# Altium footprint library SMDLibrary.PcbLib: 309 footprints (part 19 of 20)
Each footprint in its own frame and in the unit in brackets; x right, y up, seen from the top. Pads: shape width x height; smd on the part's side, far side on the other; paste and mask are expansions set on the pad; w line width, h text height; cw(c..) or ccw(c..) is an arc to the next point about the centre after c.
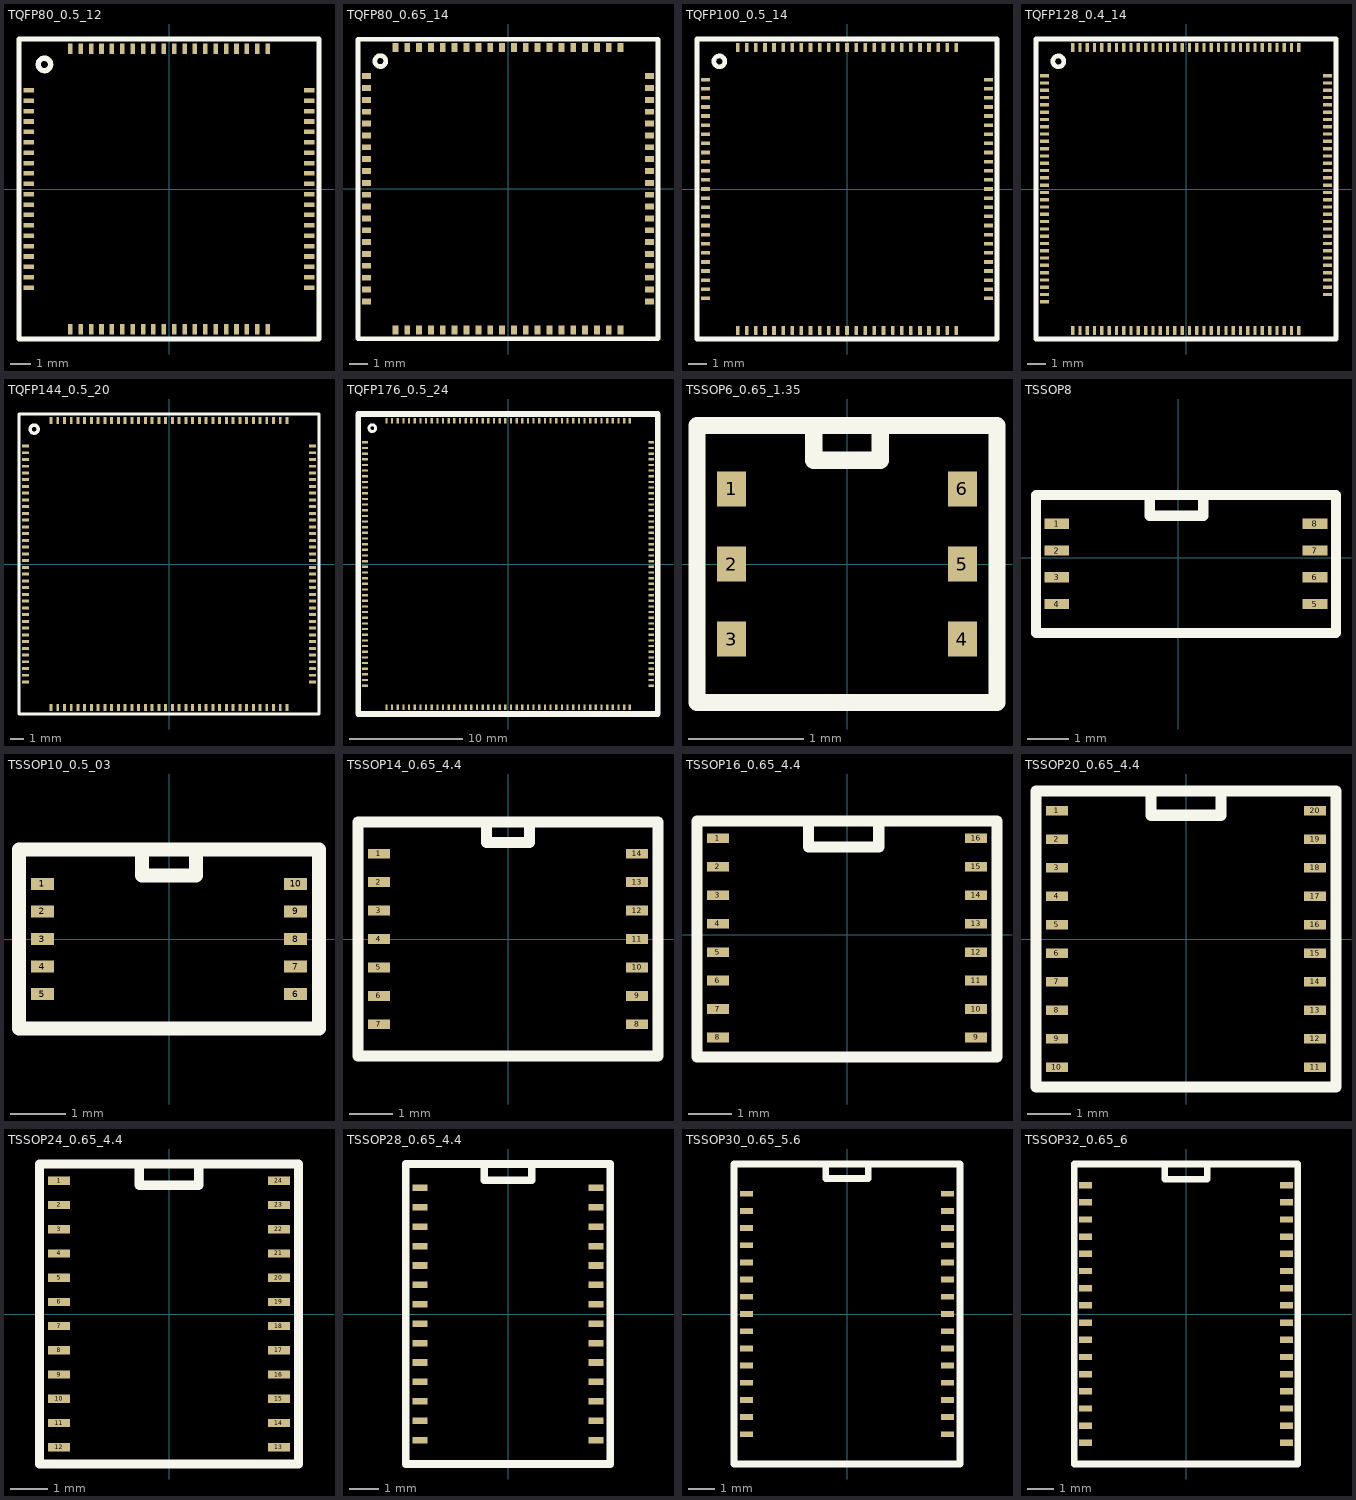
[diagram p18: the footprints below, top view; thin cyan lines are the x and y axes]

## TQFP80_0.5_12 [mm]
pads (80):
  rect 0.5x0.22 smd: 1(-6.75,4.75) 2(-6.75,4.25) 3(-6.75,3.75) 4(-6.75,3.25) 5(-6.75,2.75) 6(-6.75,2.25) 7(-6.75,1.75) 8(-6.75,1.25) 9(-6.75,0.75) 10(-6.75,0.25) 11(-6.75,-0.25) 12(-6.75,-0.75) 13(-6.75,-1.25) 14(-6.75,-1.75) 15(-6.75,-2.25) 16(-6.75,-2.75) 17(-6.75,-3.25) 18(-6.75,-3.75) 19(-6.75,-4.25) 20(-6.75,-4.75) 41(6.75,-4.75) 42(6.75,-4.25) 43(6.75,-3.75) 44(6.75,-3.25) 45(6.75,-2.75) 46(6.75,-2.25) 47(6.75,-1.75) 48(6.75,-1.25) 49(6.75,-0.75) 50(6.75,-0.25) 51(6.75,0.25) 52(6.75,0.75) 53(6.75,1.25) 54(6.75,1.75) 55(6.75,2.25) 56(6.75,2.75) 57(6.75,3.25) 58(6.75,3.75) 59(6.75,4.25) 60(6.75,4.75)
  rect 0.22x0.5 smd: 21(-4.75,-6.75) 22(-4.25,-6.75) 23(-3.75,-6.75) 24(-3.25,-6.75) 25(-2.75,-6.75) 26(-2.25,-6.75) 27(-1.75,-6.75) 28(-1.25,-6.75) 29(-0.75,-6.75) 30(-0.25,-6.75) 31(0.25,-6.75) 32(0.75,-6.75) 33(1.25,-6.75) 34(1.75,-6.75) 35(2.25,-6.75) 36(2.75,-6.75) 37(3.25,-6.75) 38(3.75,-6.75) 39(4.25,-6.75) 40(4.75,-6.75) 61(4.75,6.75) 62(4.25,6.75) 63(3.75,6.75) 64(3.25,6.75) 65(2.75,6.75) 66(2.25,6.75) 67(1.75,6.75) 68(1.25,6.75) 69(0.75,6.75) 70(0.25,6.75) 71(-0.25,6.75) 72(-0.75,6.75) 73(-1.25,6.75) 74(-1.75,6.75) 75(-2.25,6.75) 76(-2.75,6.75) 77(-3.25,6.75) 78(-3.75,6.75) 79(-4.25,6.75) 80(-4.75,6.75)
Top Overlay:
  circle w0.254: c-6,6 r0.3
  lines w0.254: -7.225,-7.225 7.225,-7.225 7.225,7.225 -7.225,7.225 -7.225,-7.225
3D body "User Library-TQFP-80.STEP": height 1.05, standoff -0.01, extent -7,-7 7,7
3D body: height 0.25, standoff 0, extent 0,0 0,0

## TQFP80_0.65_14 [mm]
pads (80):
  rect 0.5x0.32 smd: 1(-7.75,6.175) 2(-7.75,5.525) 3(-7.75,4.875) 4(-7.75,4.225) 5(-7.75,3.575) 6(-7.75,2.925) 7(-7.75,2.275) 8(-7.75,1.625) 9(-7.75,0.975) 10(-7.75,0.325) 11(-7.75,-0.325) 12(-7.75,-0.975) 13(-7.75,-1.625) 14(-7.75,-2.275) 15(-7.75,-2.925) 16(-7.75,-3.575) 17(-7.75,-4.225) 18(-7.75,-4.875) 19(-7.75,-5.525) 20(-7.75,-6.175) 41(7.75,-6.175) 42(7.75,-5.525) 43(7.75,-4.875) 44(7.75,-4.225) 45(7.75,-3.575) 46(7.75,-2.925) 47(7.75,-2.275) 48(7.75,-1.625) 49(7.75,-0.975) 50(7.75,-0.325) 51(7.75,0.325) 52(7.75,0.975) 53(7.75,1.625) 54(7.75,2.275) 55(7.75,2.925) 56(7.75,3.575) 57(7.75,4.225) 58(7.75,4.875) 59(7.75,5.525) 60(7.75,6.175)
  rect 0.32x0.5 smd: 21(-6.175,-7.75) 22(-5.525,-7.75) 23(-4.875,-7.75) 24(-4.225,-7.75) 25(-3.575,-7.75) 26(-2.925,-7.75) 27(-2.275,-7.75) 28(-1.625,-7.75) 29(-0.975,-7.75) 30(-0.325,-7.75) 31(0.325,-7.75) 32(0.975,-7.75) 33(1.625,-7.75) 34(2.275,-7.75) 35(2.925,-7.75) 36(3.575,-7.75) 37(4.225,-7.75) 38(4.875,-7.75) 39(5.525,-7.75) 40(6.175,-7.75) 61(6.175,7.75) 62(5.525,7.75) 63(4.875,7.75) 64(4.225,7.75) 65(3.575,7.75) 66(2.925,7.75) 67(2.275,7.75) 68(1.625,7.75) 69(0.975,7.75) 70(0.325,7.75) 71(-0.325,7.75) 72(-0.975,7.75) 73(-1.625,7.75) 74(-2.275,7.75) 75(-2.925,7.75) 76(-3.575,7.75) 77(-4.225,7.75) 78(-4.875,7.75) 79(-5.525,7.75) 80(-6.175,7.75)
Top Overlay:
  circle w0.254: c-7,7 r0.3
  lines w0.254: -8.225,-8.225 8.225,-8.225 8.225,8.2 -8.225,8.2 -8.225,-8.225
3D body "User Library-LQFP-80 14x14.STEP": height 1.55, standoff -0.04, extent -8.005,-8.009 8.005,8

## TQFP100_0.5_14 [mm]
pads (100):
  rect 0.5x0.2 smd: 1(-7.75,6) 2(-7.75,5.5) 3(-7.75,5) 4(-7.75,4.5) 5(-7.75,4) 6(-7.75,3.5) 7(-7.75,3) 8(-7.75,2.5) 9(-7.75,2) 10(-7.75,1.5) 11(-7.75,1) 12(-7.75,0.5) 13(-7.75,0) 14(-7.75,-0.5) 15(-7.75,-1) 16(-7.75,-1.5) 17(-7.75,-2) 18(-7.75,-2.5) 19(-7.75,-3) 20(-7.75,-3.5) 21(-7.75,-4) 22(-7.75,-4.5) 23(-7.75,-5) 24(-7.75,-5.5) 25(-7.75,-6) 51(7.75,-6) 52(7.75,-5.5) 53(7.75,-5) 54(7.75,-4.5) 55(7.75,-4) 56(7.75,-3.5) 57(7.75,-3) 58(7.75,-2.5) 59(7.75,-2) 60(7.75,-1.5) 61(7.75,-1) 62(7.75,-0.5) 63(7.75,0) 64(7.75,0.5) 65(7.75,1) 66(7.75,1.5) 67(7.75,2) 68(7.75,2.5) 69(7.75,3) 70(7.75,3.5) 71(7.75,4) 72(7.75,4.5) 73(7.75,5) 74(7.75,5.5) 75(7.75,6)
  rect 0.2x0.5 smd: 26(-6,-7.75) 27(-5.5,-7.75) 28(-5,-7.75) 29(-4.5,-7.75) 30(-4,-7.75) 31(-3.5,-7.75) 32(-3,-7.75) 33(-2.5,-7.75) 34(-2,-7.75) 35(-1.5,-7.75) 36(-1,-7.75) 37(-0.5,-7.75) 38(0,-7.75) 39(0.5,-7.75) 40(1,-7.75) 41(1.5,-7.75) 42(2,-7.75) 43(2.5,-7.75) 44(3,-7.75) 45(3.5,-7.75) 46(4,-7.75) 47(4.5,-7.75) 48(5,-7.75) 49(5.5,-7.75) 50(6,-7.75) 76(6,7.75) 77(5.5,7.75) 78(5,7.75) 79(4.5,7.75) 80(4,7.75) 81(3.5,7.75) 82(3,7.75) 83(2.5,7.75) 84(2,7.75) 85(1.5,7.75) 86(1,7.75) 87(0.5,7.75) 88(0,7.75) 89(-0.5,7.75) 90(-1,7.75) 91(-1.5,7.75) 92(-2,7.75) 93(-2.5,7.75) 94(-3,7.75) 95(-3.5,7.75) 96(-4,7.75) 97(-4.5,7.75) 98(-5,7.75) 99(-5.5,7.75) 100(-6,7.75)
Top Overlay:
  circle w0.254: c-7,7 r0.3
  lines w0.254: -8.225,-8.225 -8.225,8.225 8.225,8.225 8.225,-8.225 -8.225,-8.225
3D body "User Library-LQFP100_Grid_0_5.STEP": height 1.57, standoff -0.03, extent -8,-8 8,8
3D body: height 0.5, standoff -0.56, extent 0,0 0,0

## TQFP128_0.4_14 [mm]
pads (128):
  rect 0.5x0.18 smd: 1(-7.75,6.213) 2(-7.75,5.813) 3(-7.75,5.413) 4(-7.75,5.013) 5(-7.75,4.613) 6(-7.75,4.213) 7(-7.75,3.813) 8(-7.75,3.413) 9(-7.75,3.013) 10(-7.75,2.613) 11(-7.75,2.213) 12(-7.75,1.813) 13(-7.75,1.413) 14(-7.75,1.013) 15(-7.75,0.613) 16(-7.75,0.213) 17(-7.75,-0.187) 18(-7.75,-0.587) 19(-7.75,-0.987) 20(-7.75,-1.387) 21(-7.75,-1.787) 22(-7.75,-2.187) 23(-7.75,-2.587) 24(-7.75,-2.987) 25(-7.75,-3.387) 26(-7.75,-3.787) 27(-7.75,-4.187) 28(-7.75,-4.587) 29(-7.75,-4.987) 30(-7.75,-5.387) 31(-7.75,-5.787) 32(-7.75,-6.187) 65(7.75,-5.787) 66(7.75,-5.387) 67(7.75,-4.987) 68(7.75,-4.587) 69(7.75,-4.187) 70(7.75,-3.787) 71(7.75,-3.387) 72(7.75,-2.987) 73(7.75,-2.987) 74(7.75,-2.587) 75(7.75,-2.187) 76(7.75,-1.787) 77(7.75,-1.387) 78(7.75,-0.987) 79(7.75,-0.587) 80(7.75,-0.187) 81(7.75,0.213) 82(7.75,0.613) 83(7.75,1.013) 84(7.75,1.413) 85(7.75,1.813) 86(7.75,2.213) 87(7.75,2.613) 88(7.75,3.013) 89(7.75,3.413) 90(7.75,3.813) 91(7.75,4.213) 92(7.75,4.613) 93(7.75,5.013) 94(7.75,5.413) 95(7.75,5.813) 96(7.75,6.213)
  rect 0.18x0.5 smd: 33(-6.212,-7.75) 34(-5.813,-7.75) 35(-5.412,-7.75) 36(-5.012,-7.75) 37(-4.613,-7.75) 38(-4.212,-7.75) 39(-3.812,-7.75) 40(-3.413,-7.75) 41(-3.012,-7.75) 42(-2.613,-7.75) 43(-2.213,-7.75) 44(-1.813,-7.75) 45(-1.413,-7.75) 46(-1.013,-7.75) 47(-0.613,-7.75) 48(-0.213,-7.75) 49(0.187,-7.75) 50(0.587,-7.75) 51(0.987,-7.75) 52(1.387,-7.75) 53(1.787,-7.75) 54(2.187,-7.75) 55(2.587,-7.75) 56(2.987,-7.75) 57(3.387,-7.75) 58(3.787,-7.75) 59(4.187,-7.75) 60(4.587,-7.75) 61(4.987,-7.75) 62(5.387,-7.75) 63(5.787,-7.75) 64(6.187,-7.75) 97(6.188,7.75) 98(5.787,7.75) 99(5.388,7.75) 100(4.988,7.75) 101(4.587,7.75) 102(4.187,7.75) 103(3.788,7.75) 104(3.387,7.75) 105(2.987,7.75) 106(2.588,7.75) 107(2.187,7.75) 108(1.787,7.75) 109(1.388,7.75) 110(0.987,7.75) 111(0.587,7.75) 112(0.188,7.75) 113(-0.213,7.75) 114(-0.613,7.75) 115(-1.012,7.75) 116(-1.413,7.75) 117(-1.813,7.75) 118(-2.213,7.75) 119(-2.613,7.75) 120(-3.013,7.75) 121(-3.413,7.75) 122(-3.813,7.75) 123(-4.213,7.75) 124(-4.613,7.75) 125(-5.012,7.75) 126(-5.413,7.75) 127(-5.813,7.75) 128(-6.212,7.75)
Top Overlay:
  circle w0.254: c-7,7 r0.3
  lines w0.254: -8.225,-8.225 8.225,-8.225 8.225,8.225 -8.225,8.225 -8.225,-8.225
3D body "User Library-LQFP-128.STEP": height 1.35, standoff 0, extent -8,-8 8,8

## TQFP144_0.5_20 [mm]
pads (144):
  rect 0.5x0.22 smd: 1(-10.65,8.75) 2(-10.65,8.25) 3(-10.65,7.75) 4(-10.65,7.25) 5(-10.65,6.75) 6(-10.65,6.25) 7(-10.65,5.75) 8(-10.65,5.25) 9(-10.65,4.75) 10(-10.65,4.25) 11(-10.65,3.75) 12(-10.65,3.25) 13(-10.65,2.75) 14(-10.65,2.25) 15(-10.65,1.75) 16(-10.65,1.25) 17(-10.65,0.75) 18(-10.65,0.25) 19(-10.65,-0.25) 20(-10.65,-0.75) 21(-10.65,-1.25) 22(-10.65,-1.75) 23(-10.65,-2.25) 24(-10.65,-2.75) 25(-10.65,-3.25) 26(-10.65,-3.75) 27(-10.65,-4.25) 28(-10.65,-4.75) 29(-10.65,-5.25) 30(-10.65,-5.75) 31(-10.65,-6.25) 32(-10.65,-6.75) 33(-10.65,-7.25) 34(-10.65,-7.75) 35(-10.65,-8.25) 36(-10.65,-8.75) 73(10.65,-8.75) 74(10.65,-8.25) 75(10.65,-7.75) 76(10.65,-7.25) 77(10.65,-6.75) 78(10.65,-6.25) 79(10.65,-5.75) 80(10.65,-5.25) 81(10.65,-4.75) 82(10.65,-4.25) 83(10.65,-3.75) 84(10.65,-3.25) 85(10.65,-2.75) 86(10.65,-2.25) 87(10.65,-1.75) 88(10.65,-1.25) 89(10.65,-0.75) 90(10.65,-0.25) 91(10.65,0.25) 92(10.65,0.75) 93(10.65,1.25) 94(10.65,1.75) 95(10.65,2.25) 96(10.65,2.75) 97(10.65,3.25) 98(10.65,3.75) 99(10.65,4.25) 100(10.65,4.75) 101(10.65,5.25) 102(10.65,5.75) 103(10.65,6.25) 104(10.65,6.75) 105(10.65,7.25) 106(10.65,7.75) 107(10.65,8.25) 108(10.65,8.75)
  rect 0.22x0.5 smd: 37(-8.75,-10.65) 38(-8.25,-10.65) 39(-7.75,-10.65) 40(-7.25,-10.65) 41(-6.75,-10.65) 42(-6.25,-10.65) 43(-5.75,-10.65) 44(-5.25,-10.65) 45(-4.75,-10.65) 46(-4.25,-10.65) 47(-3.75,-10.65) 48(-3.25,-10.65) 49(-2.75,-10.65) 50(-2.25,-10.65) 51(-1.75,-10.65) 52(-1.25,-10.65) 53(-0.75,-10.65) 54(-0.25,-10.65) 55(0.25,-10.65) 56(0.75,-10.65) 57(1.25,-10.65) 58(1.75,-10.65) 59(2.25,-10.65) 60(2.75,-10.65) 61(3.25,-10.65) 62(3.75,-10.65) 63(4.25,-10.65) 64(4.75,-10.65) 65(5.25,-10.65) 66(5.75,-10.65) 67(6.25,-10.65) 68(6.75,-10.65) 69(7.25,-10.65) 70(7.75,-10.65) 71(8.25,-10.65) 72(8.75,-10.65) 109(8.75,10.65) 110(8.25,10.65) 111(7.75,10.65) 112(7.25,10.65) 113(6.75,10.65) 114(6.25,10.65) 115(5.75,10.65) 116(5.25,10.65) 117(4.75,10.65) 118(4.25,10.65) 119(3.75,10.65) 120(3.25,10.65) 121(2.75,10.65) 122(2.25,10.65) 123(1.75,10.65) 124(1.25,10.65) 125(0.75,10.65) 126(0.25,10.65) 127(-0.25,10.65) 128(-0.75,10.65) 129(-1.25,10.65) 130(-1.75,10.65) 131(-2.25,10.65) 132(-2.75,10.65) 133(-3.25,10.65) 134(-3.75,10.65) 135(-4.25,10.65) 136(-4.75,10.65) 137(-5.25,10.65) 138(-5.75,10.65) 139(-6.25,10.65) 140(-6.75,10.65) 141(-7.25,10.65) 142(-7.75,10.65) 143(-8.25,10.65) 144(-8.75,10.65)
Top Overlay:
  circle w0.254: c-10,10 r0.3
  lines w0.254: -11.125,-11.125 -11.125,11.125 11.125,11.125 11.125,-11.125 -11.125,-11.125
3D body "User Library-LQFP144-0_5.STEP": height 1.55, standoff -0.02, extent -10.886,-10.886 10.886,10.886

## TQFP176_0.5_24 [mm]
pads (176):
  rect 0.5x0.2 smd: 1(-12.65,10.75) 2(-12.65,10.25) 3(-12.65,9.75) 4(-12.65,9.25) 5(-12.65,8.75) 6(-12.65,8.25) 7(-12.65,7.75) 8(-12.65,7.25) 9(-12.65,6.75) 10(-12.65,6.25) 11(-12.65,5.75) 12(-12.65,5.25) 13(-12.65,4.75) 14(-12.65,4.25) 15(-12.65,3.75) 16(-12.65,3.25) 17(-12.65,2.75) 18(-12.65,2.25) 19(-12.65,1.75) 20(-12.65,1.25) 21(-12.65,0.75) 22(-12.65,0.25) 23(-12.65,-0.25) 24(-12.65,-0.75) 25(-12.65,-1.25) 26(-12.65,-1.75) 27(-12.65,-2.25) 28(-12.65,-2.75) 29(-12.65,-3.25) 30(-12.65,-3.75) 31(-12.65,-4.25) 32(-12.65,-4.75) 33(-12.65,-5.25) 34(-12.65,-5.75) 35(-12.65,-6.25) 36(-12.65,-6.75) 37(-12.65,-7.25) 38(-12.65,-7.75) 39(-12.65,-8.25) 40(-12.65,-8.75) 41(-12.65,-9.25) 42(-12.65,-9.75) 43(-12.65,-10.25) 44(-12.65,-10.75) 89(12.65,-10.75) 90(12.65,-10.25) 91(12.65,-9.75) 92(12.65,-9.25) 93(12.65,-8.75) 94(12.65,-8.25) 95(12.65,-7.75) 96(12.65,-7.25) 97(12.65,-6.75) 98(12.65,-6.25) 99(12.65,-5.75) 100(12.65,-5.25) 101(12.65,-4.75) 102(12.65,-4.25) 103(12.65,-3.75) 104(12.65,-3.25) 105(12.65,-2.75) 106(12.65,-2.25) 107(12.65,-1.75) 108(12.65,-1.25) 109(12.65,-0.75) 110(12.65,-0.25) 111(12.65,0.25) 112(12.65,0.75) 113(12.65,1.25) 114(12.65,1.75) 115(12.65,2.25) 116(12.65,2.75) 117(12.65,3.25) 118(12.65,3.75) 119(12.65,4.25) 120(12.65,4.75) 121(12.65,5.25) 122(12.65,5.75) 123(12.65,6.25) 124(12.65,6.75) 125(12.65,7.25) 126(12.65,7.75) 127(12.65,8.25) 128(12.65,8.75) 129(12.65,9.25) 130(12.65,9.75) 131(12.65,10.25) 132(12.65,10.75)
  rect 0.2x0.5 smd: 45(-10.75,-12.65) 46(-10.25,-12.65) 47(-9.75,-12.65) 48(-9.25,-12.65) 49(-8.75,-12.65) 50(-8.25,-12.65) 51(-7.75,-12.65) 52(-7.25,-12.65) 53(-6.75,-12.65) 54(-6.25,-12.65) 55(-5.75,-12.65) 56(-5.25,-12.65) 57(-4.75,-12.65) 58(-4.25,-12.65) 59(-3.75,-12.65) 60(-3.25,-12.65) 61(-2.75,-12.65) 62(-2.25,-12.65) 63(-1.75,-12.65) 64(-1.25,-12.65) 65(-0.75,-12.65) 66(-0.25,-12.65) 67(0.25,-12.65) 68(0.75,-12.65) 69(1.25,-12.65) 70(1.75,-12.65) 71(2.25,-12.65) 72(2.75,-12.65) 73(3.25,-12.65) 74(3.75,-12.65) 75(4.25,-12.65) 76(4.75,-12.65) 77(5.25,-12.65) 78(5.75,-12.65) 79(6.25,-12.65) 80(6.75,-12.65) 81(7.25,-12.65) 82(7.75,-12.65) 83(8.25,-12.65) 84(8.75,-12.65) 85(9.25,-12.65) 86(9.75,-12.65) 87(10.25,-12.65) 88(10.75,-12.65) 133(10.75,12.65) 134(10.25,12.65) 135(9.75,12.65) 136(9.25,12.65) 137(8.75,12.65) 138(8.25,12.65) 139(7.75,12.65) 140(7.25,12.65) 141(6.75,12.65) 142(6.25,12.65) 143(5.75,12.65) 144(5.25,12.65) 145(4.75,12.65) 146(4.25,12.65) 147(3.75,12.65) 148(3.25,12.65) 149(2.75,12.65) 150(2.25,12.65) 151(1.75,12.65) 152(1.25,12.65) 153(0.75,12.65) 154(0.25,12.65) 155(-0.25,12.65) 156(-0.75,12.65) 157(-1.25,12.65) 158(-1.75,12.65) 159(-2.25,12.65) 160(-2.75,12.65) 161(-3.25,12.65) 162(-3.75,12.65) 163(-4.25,12.65) 164(-4.75,12.65) 165(-5.25,12.65) 166(-5.75,12.65) 167(-6.25,12.65) 168(-6.75,12.65) 169(-7.25,12.65) 170(-7.75,12.65) 171(-8.25,12.65) 172(-8.75,12.65) 173(-9.25,12.65) 174(-9.75,12.65) 175(-10.25,12.65) 176(-10.75,12.65)
Top Overlay:
  circle w0.254: c-12,12 r0.3
  lines w0.5: -13.25,-13.25 -13.25,13.25 13.225,13.25 13.225,-13.25 -13.25,-13.25
3D body "User Library-LQFP176-0_5.STEP": height 1.55, standoff -0.02, extent -12.886,-12.886 12.886,12.886

## TSSOP6_0.65_1.35 [mm]
pads (6):
  rect 0.25x0.3 smd: 1(-1,0.65) 2(-1,0) 3(-1,-0.65) 4(1,-0.65) 5(1,0) 6(1,0.65)
Top Overlay:
  lines w0.15: -0.288,1.175 -0.288,0.9 0.288,0.9 0.288,1.175 ; -1.3,-1.2 -1.3,1.2 1.3,1.2 1.3,-1.2 -1.3,-1.2
3D body "User Library-TSSOP-6 (SOT-23-6 PITCH 0_65).STEP": height 1.09, standoff -0.02, extent -1.125,-1.125 1.125,1.125

## TSSOP8 [mm]
pads (8):
  rect 0.6x0.25 smd: 1(-2.95,0.825) 2(-2.95,0.175) 3(-2.95,-0.475) 4(-2.95,-1.125) 5(3.325,-1.125) 6(3.325,-0.475) 7(3.325,0.175) 8(3.325,0.825)
Top Overlay:
  lines w0.254: -0.686,1.524 -0.686,1.025 0.61,1.025 0.61,1.524 ; -3.454,-1.829 -3.454,1.524 3.835,1.524 3.835,-1.829 -3.454,-1.829
3D body "User Library-TSSOP-8 3_1x4_4.STEP": height 1.1, standoff 0, extent -3,-1.7 3.4,1.4

## TSSOP10_0.5_03 [mm]
pads (10):
  rect 0.42x0.22 smd: 1(-2.3,1) 2(-2.3,0.5) 3(-2.3,0) 4(-2.3,-0.5) 5(-2.3,-1) 6(2.3,-1) 7(2.3,-0.5) 8(2.3,0) 9(2.3,0.5) 10(2.3,1)
Top Overlay:
  lines w0.254: -0.487,1.6 -0.487,1.15 0.487,1.15 0.487,1.6 ; -2.725,-1.625 -2.725,1.625 2.725,1.625 2.725,-1.625 -2.725,-1.625
3D body "User Library-TSSOP-10.STEP": height 1.1, standoff 0, extent -2.5,-1.5 2.5,1.5

## TSSOP14_0.65_4.4 [mm]
pads (14):
  rect 0.5x0.22 smd: 1(-2.95,1.95) 2(-2.95,1.3) 3(-2.95,0.65) 4(-2.95,0) 5(-2.95,-0.65) 6(-2.95,-1.3) 7(-2.95,-1.95) 8(2.95,-1.95) 9(2.95,-1.3) 10(2.95,-0.65) 11(2.95,0) 12(2.95,0.65) 13(2.95,1.3) 14(2.95,1.95)
Top Overlay:
  lines w0.254: -0.487,2.65 -0.487,2.2 0.487,2.2 0.487,2.65 ; -3.425,-2.675 -3.425,2.675 3.425,2.675 3.425,-2.675 -3.425,-2.675
3D body "User Library-TSSOP-14 5_1x4_4.STEP": height 1.08, standoff -0.02, extent -3.2,-2.55 3.2,2.55

## TSSOP16_0.65_4.4 [mm]
pads (16):
  rect 0.5x0.22 smd: 1(-2.95,2.2) 2(-2.95,1.55) 3(-2.95,0.9) 4(-2.95,0.25) 5(-2.95,-0.4) 6(-2.95,-1.05) 7(-2.95,-1.7) 8(-2.95,-2.35) 9(2.95,-2.35) 10(2.95,-1.7) 11(2.95,-1.05) 12(2.95,-0.4) 13(2.95,0.25) 14(2.95,0.9) 15(2.95,1.55) 16(2.95,2.2)
Top Overlay:
  lines w0.254: -0.875,2.54 -0.875,2 0.725,2 0.725,2.565 ; -3.425,-2.794 -3.425,2.591 3.425,2.591 3.425,-2.794 -3.425,-2.794
3D body "User Library-TSSOP-16 5_1x4_4.STEP": height 1.1, standoff 0, extent -3.2,-2.65 3.2,2.45

## TSSOP20_0.65_4.4 [mm]
pads (20):
  rect 0.5x0.22 smd: 1(-2.95,2.925) 2(-2.95,2.275) 3(-2.95,1.625) 4(-2.95,0.975) 5(-2.95,0.325) 6(-2.95,-0.325) 7(-2.95,-0.975) 8(-2.95,-1.625) 9(-2.95,-2.275) 10(-2.95,-2.925) 11(2.95,-2.925) 12(2.95,-2.275) 13(2.95,-1.625) 14(2.95,-0.975) 15(2.95,-0.325) 16(2.95,0.325) 17(2.95,0.975) 18(2.95,1.625) 19(2.95,2.275) 20(2.95,2.925)
Top Overlay:
  lines w0.254: -0.8,3.365 -0.8,2.825 0.8,2.825 0.8,3.35 ; -3.425,-3.378 3.425,-3.378 3.425,3.378 -3.425,3.378 -3.425,-3.378
3D body "User Library-TSSOP20-1.STEP": height 1.09, standoff 0, extent -3.14,-3.25 3.14,3.25

## TSSOP24_0.65_4.4 [mm]
pads (24):
  rect 0.6x0.22 smd: 1(-2.95,3.575) 2(-2.95,2.925) 3(-2.95,2.275) 4(-2.95,1.625) 5(-2.95,0.975) 6(-2.95,0.325) 7(-2.95,-0.325) 8(-2.95,-0.975) 9(-2.95,-1.625) 10(-2.95,-2.275) 11(-2.95,-2.925) 12(-2.95,-3.575) 13(2.95,-3.575) 14(2.95,-2.925) 15(2.95,-2.275) 16(2.95,-1.625) 17(2.95,-0.975) 18(2.95,-0.325) 19(2.95,0.325) 20(2.95,0.975) 21(2.95,1.625) 22(2.95,2.275) 23(2.95,2.925) 24(2.95,3.575)
Top Overlay:
  lines w0.254: -0.8,3.99 -0.8,3.45 0.8,3.45 0.8,3.975 ; -3.475,-4.025 3.475,-4.025 3.475,4.025 -3.475,4.025 -3.475,-4.025
3D body "User Library-TSSOP-24.STEP": height 1.2, standoff 0, extent -3.2,-3.9 3.2,3.9

## TSSOP28_0.65_4.4 [mm]
pads (28):
  rect 0.5x0.22 smd: 1(-2.95,4.225) 2(-2.95,3.575) 3(-2.95,2.925) 4(-2.95,2.275) 5(-2.95,1.625) 6(-2.95,0.975) 7(-2.95,0.325) 8(-2.95,-0.325) 9(-2.95,-0.975) 10(-2.95,-1.625) 11(-2.95,-2.275) 12(-2.95,-2.925) 13(-2.95,-3.575) 14(-2.95,-4.225) 15(2.95,-4.225) 16(2.95,-3.575) 17(2.95,-2.925) 18(2.95,-2.275) 19(2.95,-1.625) 20(2.95,-0.975) 21(2.95,-0.325) 22(2.95,0.325) 23(2.95,0.975) 24(2.95,1.625) 25(2.95,2.275) 26(2.95,2.925) 27(2.95,3.575) 28(2.95,4.225)
Top Overlay:
  lines w0.254: -0.8,5.015 -0.8,4.475 0.8,4.475 0.8,5 ; -3.425,-5.025 3.425,-5.025 3.425,5.025 -3.425,5.025 -3.425,-5.025
3D body "User Library-TSSOP-28 9_8x4_4.STEP": height 1.1, standoff 0, extent -3.175,-4.9 3.225,4.9

## TSSOP30_0.65_5.6 [mm]
pads (30):
  rect 0.5x0.22 smd: 1(-3.8,4.55) 2(-3.8,3.9) 3(-3.8,3.25) 4(-3.8,2.6) 5(-3.8,1.95) 6(-3.8,1.3) 7(-3.8,0.65) 8(-3.8,0) 9(-3.8,-0.65) 10(-3.8,-1.3) 11(-3.8,-1.95) 12(-3.8,-2.6) 13(-3.8,-3.25) 14(-3.8,-3.9) 15(-3.8,-4.55) 16(3.8,-4.55) 17(3.8,-3.9) 18(3.8,-3.25) 19(3.8,-2.6) 20(3.8,-1.95) 21(3.8,-1.3) 22(3.8,-0.65) 23(3.8,0) 24(3.8,0.65) 25(3.8,1.3) 26(3.8,1.95) 27(3.8,2.6) 28(3.8,3.25) 29(3.8,3.9) 30(3.8,4.55)
Top Overlay:
  lines w0.254: -0.8,5.665 -0.8,5.125 0.8,5.125 0.8,5.65 ; -4.275,-5.675 4.275,-5.675 4.275,5.675 -4.275,5.675 -4.275,-5.675
3D body "User Library-TSSOP-30 11_1x6_2.STEP": height 1.1, standoff 0, extent -4.05,-5.55 4.05,5.55

## TSSOP32_0.65_6 [mm]
pads (32):
  rect 0.5x0.24 smd: 1(-3.8,4.875) 2(-3.8,4.225) 3(-3.8,3.575) 4(-3.8,2.925) 5(-3.8,2.275) 6(-3.8,1.625) 7(-3.8,0.975) 8(-3.8,0.325) 9(-3.8,-0.325) 10(-3.8,-0.975) 11(-3.8,-1.625) 12(-3.8,-2.275) 13(-3.8,-2.925) 14(-3.8,-3.575) 15(-3.8,-4.225) 16(-3.8,-4.875) 17(3.8,-4.875) 18(3.8,-4.225) 19(3.8,-3.575) 20(3.8,-2.925) 21(3.8,-2.275) 22(3.8,-1.625) 23(3.8,-0.975) 24(3.8,-0.325) 25(3.8,0.325) 26(3.8,0.975) 27(3.8,1.625) 28(3.8,2.275) 29(3.8,2.925) 30(3.8,3.575) 31(3.8,4.225) 32(3.8,4.875)
Top Overlay:
  lines w0.254: -0.8,5.64 -0.8,5.1 0.8,5.1 0.8,5.625 ; -4.225,-5.675 -4.225,5.675 4.225,5.675 4.225,-5.675 -4.225,-5.675
3D body "User Library-TSSOP-32 11_1x6_2.STEP": height 1.08, standoff -0.02, extent -4.05,-5.55 4.05,5.55